# Altium schematic symbol library BARKO_SCHLIB.SchLib: 1064 symbols (part 5 of 11) (continued)
## IC-MC33063AVDG (continued)
IC REG BUCK BOOST INV ADJ 8SOIC; Manufacturer: ON Semiconductor; .PCBCHK: USED; .Creator: F:TALI; Max Input Voltage: 40V; Number of Outputs: 1; Output Current: 1.5A; Min Input Voltage: 3V; Switching Frequency: 100kHz; Synchronous Rectifier: No; Min Output Voltage: 1.25V; Topology: Buck-Boost; Output Type: Adjustable; Washability: OK; .SCHCHK: USED; Supplier 1: Digi-Key; Manufacturer Part Number: MC33063AVDG; Stock 1: 585; Pricing 1: 1=0.85000, 10=0.74800, 100=0.53300, 500=0.43092, 1000=0.32886 (USD); RoHS: Yes; Mount: Surface Mount; Case/Package: SOIC; Number of Pins: 8; Contact Plating: Tin,Matte; Min Operating Temperature: -40°C; Max Operating Temperature: 125°C; Output Voltage: 40V; Packaging: Rail/Tube; Max Output Current: 1.5A; Package Quantity: 98; Max Output Voltage: 40V; Length: 5mm; Height: 1.5mm; Width: 4mm; Radiation Hardening: No; REACH SVHC: No SVHC; Lead Free: Lead Free; Halogen Free: Halogen Free; ComponentLink1URL: https://datasheet.ciiva.com/16374/mc34063a-d-16374534.pdf?src-supplier=Future+Electronics; ComponentLink1Description: https://datasheet.ciiva.com/16374/mc34063a-d-16374534.pdf?src-supplier=Future+Electronics; ComponentLink2URL: https://datasheet.ciiva.com/2025/mc34063a-d-2025197.pdf?src-supplier=Digi-Key; ComponentLink2Description: https://datasheet.ciiva.com/2025/mc34063a-d-2025197.pdf?src-supplier=Digi-Key; Supplier Part Number 1: MC33063AVDG-ND
footprint SOIC8
pins: 1 SC (oc) "Switch Collector", 2 SE (oe) "Switch Emitter", 3 TC "Timing Capacitor", 4 GND (power), 5 CII (in) "Comparator Inverting Input", 6 VCC (power), 7 Ipk (in), 8 DC (oc) "Driver Collector"

## IC-MC34063ADG
designator U?, comment MC34063ADG  Case/Package: SOIC8
IC REG BUCK BOOST INV ADJ 8SOIC; Manufacturer: ON Semiconductor; Output Voltage: 40V; Max Output Current: 1.5A; Number of Outputs: 1; Min Input Voltage: 3V; Switching Frequency: 100kHz; Synchronous Rectifier: No; Min Output Voltage: 1.25V; Topology: Buck-Boost; Output Type: Adjustable; .PCBCHK: USED; .Creator: F:TALI; Washability: OK; Supplier 1: Digi-Key; Manufacturer Part Number: MC34063ADG; Stock 1: 0; Pricing 1: 1=0.58, 98=0.46061, 196=0.36847, 588=0.28952, 1078=0.22372 (USD); Mount: Surface Mount; Number of Pins: 8; Contact Plating: Matte,Tin; Min Operating Temperature: 0°C; Max Operating Temperature: 70°C; Package Quantity: 98; Packaging: Rail/Tube; Max Input Voltage: 40V; Output Current: 1.5A; Max Output Voltage: 40V; Length: 5mm; Height: 1.5mm; Width: 4mm; Radiation Hardening: No; Lead Free: Lead Free; REACH SVHC: No SVHC; Halogen Free: Halogen Free; ComponentLink1URL: http://www.onsemi.com/pub/Collateral/MC34063A-D.PDF; ComponentLink1Description: http://www.onsemi.com/pub/Collateral/MC34063A-D.PDF; ComponentLink2URL: https://www.distrelec.biz/Web/Downloads/6_/en/buONSemico_Schaltr-MC3406_EN.pdf?mime=application%2Fpdf; ComponentLink2Description: https://www.distrelec.biz/Web/Downloads/6_/en/buONSemico_Schaltr-MC3406_EN.pdf?mime=application%2Fpdf; ComponentLink3URL: http://components.arrow.com/part/dataview/40463195S7042617N5236; ComponentLink3Description: http://components.arrow.com/part/dataview/40463195S7042617N5236; ComponentLink4URL: http://www.farnell.com/datasheets/684078.pdf; ComponentLink4Description: http://www.farnell.com/datasheets/684078.pdf; ComponentLink5URL: http://www.rapidonline.com/pdf/47-3478.pdf; ComponentLink5Description: http://www.rapidonline.com/pdf/47-3478.pdf; Supplier Part Number 1: MC34063ADGOS-ND; .SCHCHK: USED
footprint SOIC8
pins: 1 SWITCH COLLECTOR, 2 SWITCH EMITTER, 3 TIMING CAPACITOR, 4 GND, 5 COMPARATOR INVERTING, 6 VCC, 7 Ipk SENSE, 8 DRIVER COLLECTOR

## IC-MCP6L01UT
designator U?, comment MCP6L01UT
IC OPAMP GP 1 CIRCUIT SOT23-5; Manufacturer: Microchip; Manufacturer Part Number: MCP6L01UT-E/OT; Max Supply Voltage: 6V; Min Supply Voltage: 1.8V; Voltage Gain: 105dB; Gain Bandwidth Product: 1MHz; Number of Channels: 1; Output Current: 20mA; Slew Rate: 0.6V/µs; Nominal Supply Current: 85uA; Common Mode Rejection Ratio: 78dB; Input Offset Voltage (Vos): 5mV; Input Bias Current: 2pA; Power Supply Rejection Ratio (PSRR): 83dB; Washability: OK; .Creator: M.OZKAN; .PCBCHK: USED; ComponentLink2Description: Datasheet; ComponentLink1Description: Manufacturer URL; PackageDescription: 5-Lead Plastic Small Outline Transistor (OT) [SOT-23]; PackageVersion: revBB, Aug-2009; Code_IPC: SOT23-5; PackageReference: SOT-23-OT5; ComponentLink2URL: http://ww1.microchip.com/downloads/en/DeviceDoc/22140b.pdf; ComponentLink1URL: http://www.microchip.com/; DatasheetVersion: revB, Sep-2011; ComponentLink3Description: Package Specification; RevisionNote: URLs added. DatasheetVersion updated.; ComponentLink3URL: http://www.microchip.com/stellent/groups/techpub_sg/documents/packagingspec/en012702.pdf; Supplier 1: Digi-Key; Supplier Part Number 1: MCP6L01UT-E/OTCT-ND; Stock 1: 4680; Pricing 1: 1=0.25000, 25=0.21000 (USD); RoHS: Yes; Mount: Surface Mount; Case/Package: SOT-23; Number of Pins: 5; Contact Plating: Tin,Matte; Min Operating Temperature: -40°C; Max Operating Temperature: 125°C; Packaging: Tape and Reel; Bandwidth: 1MHz; Unity Gain Bandwidth Product: 1MHz; Package Quantity: 3000; Number of Circuits: 1; Number of Elements: 1; Number of Amplifiers: 1; Length: 3.1mm; Height: 1.3mm; Width: 1.8mm; Radiation Hardening: No; REACH SVHC: No SVHC; Lead Free: Lead Free; ComponentLink4URL: https://datasheet.ciiva.com/1793/22140b-1793072.pdf?src-supplier=Digi-Key; ComponentLink4Description: https://datasheet.ciiva.com/1793/22140b-1793072.pdf?src-supplier=Digi-Key; ComponentLink5URL: https://datasheet.ciiva.com/22829/0900766b80db6492-22829231.pdf?src-supplier=RSComponents; ComponentLink5Description: https://datasheet.ciiva.com/22829/0900766b80db6492-22829231.pdf?src-supplier=RSComponents; ComponentLink6URL: https://datasheet.ciiva.com/26922/getdatasheetpartid-760447-26922790.pdf?src-supplier=Verical; ComponentLink6Description: https://datasheet.ciiva.com/26922/getdatasheetpartid-760447-26922790.pdf?src-supplier=Verical; ComponentLink7URL: https://datasheet.ciiva.com/8079/1669460-8079017.pdf?src-supplier=Element14; ComponentLink7Description: https://datasheet.ciiva.com/8079/1669460-8079017.pdf?src-supplier=Element14; ComponentLink8URL: https://datasheet.ciiva.com/16217/filehandler-aspxddocname-en540137-16217051.pdf?src-supplier=Future+Electronics; ComponentLink8Description: https://datasheet.ciiva.com/16217/filehandler-aspxddocname-en540137-16217051.pdf?src-supplier=Future+Electronics; ComponentLink9URL: https://datasheet.ciiva.com/17572/22140b-17572379.pdf?src-supplier=Avnet+Europe; ComponentLink9Description: https://datasheet.ciiva.com/17572/22140b-17572379.pdf?src-supplier=Avnet+Europe; ComponentLink10URL: https://datasheet.ciiva.com/1793/22140b-1793070.pdf?src-supplier=Digi-Key; ComponentLink10Description: https://datasheet.ciiva.com/1793/22140b-1793070.pdf?src-supplier=Digi-Key; ComponentLink11URL: https://datasheet.ciiva.com/1793/22140b-1793071.pdf?src-supplier=Digi-Key; ComponentLink11Description: https://datasheet.ciiva.com/1793/22140b-1793071.pdf?src-supplier=Digi-Key; ComponentLink12URL: https://datasheet.ciiva.com/11710/22140b-11710575.pdf?src-supplier=Avnet; ComponentLink12Description: https://datasheet.ciiva.com/11710/22140b-11710575.pdf?src-supplier=Avnet; ComponentLink13URL: https://datasheet.ciiva.com/41459/001085046-da-01-en-ic-opamp-1-0-mcp6l01ut-e-ot-sot-23-5-mcp-41459271.pdf?src-supplier=Conrad; ComponentLink13Description: https://datasheet.ciiva.com/41459/001085046-da-01-en-ic-opamp-1-0-mcp6l01ut-e-ot-sot-23-5-mcp-41459271.pdf?src-supplier=Conrad; .SCHCHK: USED
footprint SOT23-5
pins: 1 VIN+ (in), 2 VSS (power), 3 VIN- (in), 4 VOUT (out), 5 VDD (power)

## IC-MCP3561T-E/NC
designator U?, comment MCP3561T
IC ADC 24BIT SIGMA-DELTA 20UQFN; Manufacturer: Microchip; Manufacturer Part Number: MCP3561T-E/NC; Supplier 1: Digi-Key; Supplier Part Number 1: MCP3561T-E/NCCT-ND; Stock: 2998; Pricing: 1=2.95, 25=2.46, 100=2.24 (USD); RoHS: No; ComponentLink1Description: datasheet; ComponentLink1URL: https://ww1.microchip.com/downloads/en/DeviceDoc/MCP3561-2-4-Two-Four-Eight-Channel-153.6-ksps-Low-Noise-24-Bit-Delta-Sigma-ADCs-DS20006181B.pdf
footprint UQFN-20 EP (QFN, 20-Leads, Body 3x3mm, , Thermal Pad 1.7x1.7mm, IPC High Density)
pins: 1 REFIN_N, 2 REFIN_P, 3 CH0, 4 CH1, 5 NC1, 6 NC2, 7 NC3, 8 NC4, 9 NC5, 10 NC6, 11 ~{CS}, 12 SCK, 13 SDI, 14 SDO, 15 ~{IRQ}/MDAT, 16 MCLK, 17 DGND, 18 DVDD, 19 AVDD, 20 AGND, 21 AGND

## IC-MCP3564T-E/NC
designator U?, comment MCP3564T
IC ADC 24BIT SIGMA-DELTA 20UQFN; Manufacturer: Microchip; Manufacturer Part Number: MCP3564T-E/NC; Supplier 1: Digi-Key; Supplier Part Number 1: MCP3564T-E/NCCT-ND; Stock: 3226; Pricing: 1=6.06, 25=5.05, 100=4.59 (USD); RoHS: No
footprint UQFN-20 EP (QFN, 20-Leads, Body 3x3mm, , Thermal Pad 1.7x1.7mm, IPC High Density)
pins: 1 REFIN_N, 2 REFIN_P, 3 CH0, 4 CH1, 5 CH2, 6 CH3, 7 CH4, 8 CH5, 9 CH6, 10 CH7, 11 ~{CS}, 12 SCK, 13 SDI, 14 SDO, 15 ~{IRQ}/MDAT, 16 MCLK, 17 DGND, 18 DVDD, 19 AVDD, 20 AGND, 21 AGND

## IC-MIC1555YM5-TR
designator U?, comment MIC1555Y
IC OSC SINGLE TIMER 5MHZ SOT23-5; Manufacturer: Microchip; Manufacturer Part Number: MIC1555YM5-TR; Washability: OK; .Creator: M.OZKAN; .PCBCHK: USED; Supplier 1: Digi-Key; Supplier Part Number 1: 576-2576-1-ND; Stock: 4358; Pricing: 1=0.79, 25=0.66, 100=0.6 (USD); RoHS: Yes; ComponentLink1URL: https://datasheet.ciiva.com/15152/getdatasheetpartid-302289-15152644.pdf?src-supplier=Verical; ComponentLink1Description: https://datasheet.ciiva.com/15152/getdatasheetpartid-302289-15152644.pdf?src-supplier=Verical; ComponentLink2URL: https://datasheet.ciiva.com/6668/mic1555-6668311.pdf?src-supplier=Digi-Key; ComponentLink2Description: https://datasheet.ciiva.com/6668/mic1555-6668311.pdf?src-supplier=Digi-Key; ComponentLink3URL: https://datasheet.ciiva.com/6668/mic1555-6668313.pdf?src-supplier=Digi-Key; ComponentLink3Description: https://datasheet.ciiva.com/6668/mic1555-6668313.pdf?src-supplier=Digi-Key; ComponentLink4URL: https://datasheet.ciiva.com/6668/mic1555-6668315.pdf?src-supplier=Digi-Key; ComponentLink4Description: https://datasheet.ciiva.com/6668/mic1555-6668315.pdf?src-supplier=Digi-Key; .SCHCHK: USED
footprint SOT23-5
pins: 1 VS, 2 GND, 3 OUT, 4 TRG, 5 THR

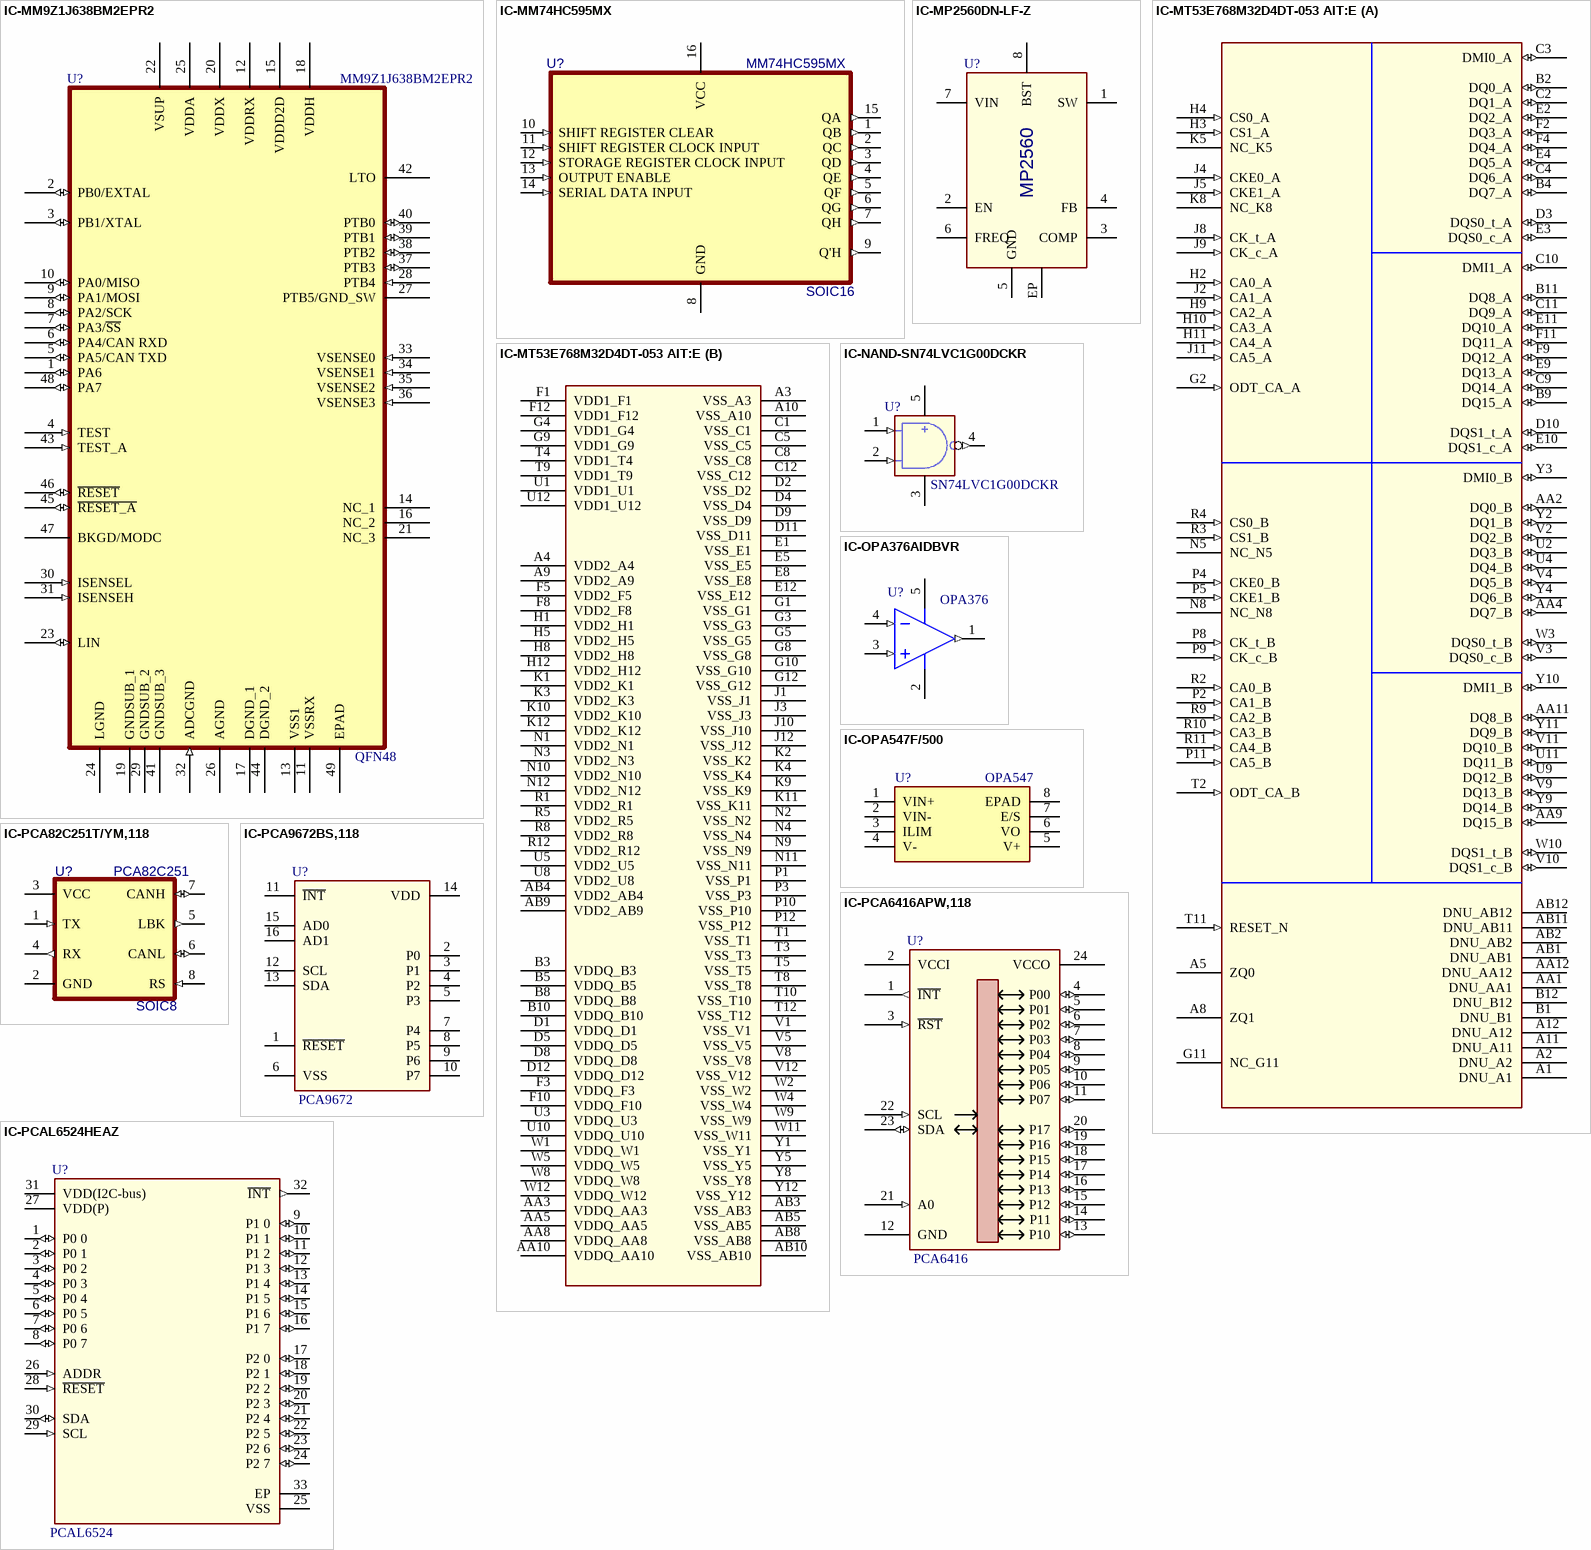
[diagram p16: symbols IC-MM9Z1J638BM2EPR2 to IC-PCAL6524HEAZ]

## IC-MM9Z1J638BM2EPR2
designator U?, comment MM9Z1J638BM2EPR2  Case/Package: QFN48
Battery Sensor Lead-Acid 30mA 2.5V 48-Pin QFN EP T/R; Manufacturer: NXP Freescale; Interface: CAN; Operating Supply Voltage: 28V; .Creator: F:TALI; .PCBCHK: USED; Washability: OK; Supplier 1: Digi-Key; Manufacturer Part Number: MM9Z1J638BM2EPR2; Stock 1: 0; Pricing 1: 2000=5.4538 (USD); Mount: Surface Mount; Number of Pins: 48; Min Operating Temperature: -40°C; Max Operating Temperature: 125°C; Output Current: 30mA; Output Voltage: 2.5V; Packaging: Tape and Reel; Radiation Hardening: No; ComponentLink1URL: http://www.freescale.com/files/analog/doc/data_sheet/MM9Z1_638D1.pdf; ComponentLink1Description: http://www.freescale.com/files/analog/doc/data_sheet/MM9Z1_638D1.pdf; Supplier Part Number 1: MM9Z1J638BM2EPR2-ND; .SCHCHK: USED
footprint QFN-EP-48
pins: 1 PA6 (io), 2 PB0/EXTAL (io), 3 PB1/XTAL (io), 4 TEST (in), 5 PA5/CAN TXD (io), 6 PA4/CAN RXD (io), 7 PA3/~{SS} (io), 8 PA2/SCK (io), 9 PA1/MOSI (io), 10 PA0/MISO (io), 11 VSSRX (power), 12 VDDRX (power), 13 VSS1 (power), 14 NC_1, 15 VDDD2D (power), 16 NC_2, 17 DGND_1 (power), 18 VDDH (power), 19 GNDSUB_1 (power), 20 VDDX (power), 21 NC_3, 22 VSUP (power), 23 LIN (io), 24 LGND (power), 25 VDDA (power), 26 AGND (power), 27 PTB5/GND_SW, 28 PTB4 (in), 29 GNDSUB_2 (power), 30 ISENSEL (in), 31 ISENSEH (in), 32 ADCGND (in), 33 VSENSE0 (in), 34 VSENSE1 (in), 35 VSENSE2 (in), 36 VSENSE3 (in), 37 PTB3 (io), 38 PTB2 (io), 39 PTB1 (io), 40 PTB0 (io), 41 GNDSUB_3 (power), 42 LTO, 43 TEST_A (in), 44 DGND_2 (power), 45 ~{RESET_A} (io), 46 ~{RESET} (io), 47 BKGD/MODC (oc), 48 PA7 (io), 49 EPAD (power)

## IC-MM74HC595MX
designator U?, comment MM74HC595MX  Case/Package: SOIC16
IC SHIFT REGISTER 8-BIT 16-SOIC; Manufacturer: ON Semiconductor / Fairchild; Direction: Unidirectional; Min Supply Voltage: 2V; Max Supply Voltage: 6V; Number of Elements: 1; Propagation Delay: 40ns; Number of Inputs: 5; Number of Bits per Element: 8; Number of Output Lines: 9; Quiescent Current: 8uA; .PCBCHK: USED; .Creator: F:TALI; Washability: OK; Supplier 1: Digi-Key; Manufacturer Part Number: MM74HC595MX; Stock 1: 1286; Pricing 1: 1=0.59, 10=0.508, 100=0.379, 500=0.29774, 1000=0.23008 (USD); Mount: Surface Mount; Number of Pins: 16; Weight: 0.005044oz; Contact Plating: Matte,Tin; Min Operating Temperature: -40°C; Max Operating Temperature: 85°C; Logic Function: Shift Register; Package Quantity: 2500; Packaging: Tape and Reel; Number of Circuits: 1; Number of Input Lines: 1; Number of Bits: 8; Turn-On Delay Time: 40ns; Voltage: 6V; Length: 10mm; Height: 1.5mm; Width: 4mm; Radiation Hardening: No; REACH SVHC: No SVHC; Lead Free: Lead Free; ComponentLink1URL: https://www.verical.com/server-webapp/html/getDatasheet?partID=88243; ComponentLink1Description: https://www.verical.com/server-webapp/html/getDatasheet?partID=88243; ComponentLink2URL: https://www.fairchildsemi.com/datasheets/MM/MM74HC595.pdf; ComponentLink2Description: https://www.fairchildsemi.com/datasheets/MM/MM74HC595.pdf; ComponentLink3URL: http://www.jameco.com/Jameco/Products/ProdDS/988047.pdf; ComponentLink3Description: http://www.jameco.com/Jameco/Products/ProdDS/988047.pdf; ComponentLink4URL: http://www.fairchildsemi.com/ds/MM/MM74HC595.pdf; ComponentLink4Description: http://www.fairchildsemi.com/ds/MM/MM74HC595.pdf; Supplier Part Number 1: MM74HC595MXDKR-ND; .SCHCHK: USED
footprint SOIC16
pins: 1 QB (out), 2 QC (out), 3 QD (out), 4 QE (out), 5 QF (out), 6 QG (out), 7 QH (out), 8 GND (power), 9 Q'H (out), 10 SHIFT REGISTER CLEAR (in), 11 SHIFT REGISTER CLOCK INPUT (in), 12 STORAGE REGISTER CLOCK INPUT (in), 13 OUTPUT ENABLE (in), 14 SERIAL DATA INPUT (in), 15 QA (out), 16 VCC (power)

## IC-MP2560DN-LF-Z
designator U?, comment MP2560
IC REG BUCK ADJ 2.5A; Manufacturer: Monolithic Power Systems; Manufacturer Part Number: MP2560DN-LF-Z; Number of Outputs: 1; Output Voltage: 39V; Min Input Voltage: 4.5V; Max Input Voltage: 42V; Efficiency: 93%; Min Output Voltage: 800mV; Switching Frequency: 4MHz; Synchronous Rectifier: No; Output Type: Adjustable; Output Configuration: Positive; Washability: OK; .Creator: M.OZKAN; .PCBCHK: USED; Supplier 1: Digi-Key; Supplier Part Number 1: 1589-1601-6-ND; Stock 1: 868; Pricing 1: 1=3.42, 10=3.07, 25=2.9024, 100=2.3865, 250=2.1414, 500=2.064, 1000=1.7157 (USD); Mount: Surface Mount; Case/Package: SOIC; Min Operating Temperature: -40°C; Max Operating Temperature: 85°C; Package Quantity: 2500; Packaging: Tape and Reel; Max Output Current: 2.5A; Max Output Voltage: 39V; Output Current: 2.5A; Operating Supply Voltage: 42V; Radiation Hardening: No; Lead Free: Lead Free; ComponentLink1URL: https://www.monolithicpower.com/pub/media/document/MP2560_r1.21.pdf?src-supplier=Digi-Key; ComponentLink1Description: https://www.monolithicpower.com/pub/media/document/MP2560_r1.21.pdf?src-supplier=Digi-Key; ComponentLink2URL: http://www.mouser.com/ds/2/277/MP2560_r1.21-477456.pdf?src-supplier=Mouser; ComponentLink2Description: http://www.mouser.com/ds/2/277/MP2560_r1.21-477456.pdf?src-supplier=Mouser; ComponentLink3URL: http://www.monolithicpower.com/Page/DownLoad.aspx?ListID=149b7d2b-0bb2-4ba6-a219-a0495acb8b0b&&ItemID=28&src-supplier=Avnet; ComponentLink3Description: http://www.monolithicpower.com/Page/DownLoad.aspx?ListID=149b7d2b-0bb2-4ba6-a219-a0495acb8b0b&&ItemID=28&src-supplier=Avnet; ComponentLink4URL: http://www.monolithicpower.com/DesktopModules/DocumentManage/API/Document/getDocument?id=1798&src-supplier=Digi-Key; ComponentLink4Description: http://www.monolithicpower.com/DesktopModules/DocumentManage/API/Document/getDocument?id=1798&src-supplier=Digi-Key; .SCHCHK: USED
footprint SOIC8-EP (SOIC, 8-Leads, Body 5x4mm, Pitch 1.27mm, IPC Low Density)
pins: 1 SW, 2 EN, 3 COMP, 4 FB, 5 GND, 6 FREQ, 7 VIN, 8 BST, EP GND

## IC-MT53E768M32D4DT-053 AIT:E
designator U?, comment MT53E768M32D4DT-053 AIT:E  (value not drawn)
IC MEM MOBILE LPDDR4 SDRAM 768 Meg x 32 1.1V VFBGA200; Manufacturer Part Number: MT53E768M32D4DT-053 AIT:E
footprint 200-FBGA
part A pins: A1 DNU_A1, A2 DNU_A2, A5 ZQ0, A8 ZQ1, A11 DNU_A11, A12 DNU_A12, AA1 DNU_AA1, AA2 DQ0_B (io), AA4 DQ7_B (io), AA9 DQ15_B (io), AA11 DQ8_B (io), AA12 DNU_AA12, AB1 DNU_AB1, AB2 DNU_AB2, AB11 DNU_AB11, AB12 DNU_AB12, B1 DNU_B1, B2 DQ0_A (io), B4 DQ7_A (io), B9 DQ15_A (io), B11 DQ8_A (io), B12 DNU_B12, C2 DQ1_A (io), C3 DMI0_A (io), C4 DQ6_A (io), C9 DQ14_A (io), C10 DMI1_A (io), C11 DQ9_A (io), D3 DQS0_t_A (io), D10 DQS1_t_A (io), E2 DQ2_A (io), E3 DQS0_c_A (io), E4 DQ5_A (io), E9 DQ13_A (io), E10 DQS1_c_A (io), E11 DQ10_A (io), F2 DQ3_A (io), F4 DQ4_A (io), F9 DQ12_A (io), F11 DQ11_A (io), G2 ODT_CA_A (in), G11 NC_G11, H2 CA0_A (in), H3 CS1_A (in), H4 CS0_A (in), H9 CA2_A (in), H10 CA3_A (in), H11 CA4_A (in), J2 CA1_A (in), J4 CKE0_A (in), J5 CKE1_A (in), J8 CK_t_A (in), J9 CK_c_A (in), J11 CA5_A (in), K5 NC_K5, K8 NC_K8, N5 NC_N5, N8 NC_N8, P2 CA1_B (in), P4 CKE0_B (in), P5 CKE1_B (in), P8 CK_t_B (in), P9 CK_c_B (in), P11 CA5_B (in), R2 CA0_B (in), R3 CS1_B (in), R4 CS0_B (in), R9 CA2_B (in), R10 CA3_B (in), R11 CA4_B (in), T2 ODT_CA_B (in), T11 RESET_N (in), U2 DQ3_B (io), U4 DQ4_B (io), U9 DQ12_B (io), U11 DQ11_B (io), V2 DQ2_B (io), V3 DQS0_c_B (io), V4 DQ5_B (io), V9 DQ13_B (io), V10 DQS1_c_B (io), V11 DQ10_B (io), W3 DQS0_t_B (io), W10 DQS1_t_B (io), Y2 DQ1_B (io), Y3 DMI0_B (io), Y4 DQ6_B (io), Y9 DQ14_B (io), Y10 DMI1_B (io), Y11 DQ9_B (io)
part B pins: A3 VSS_A3 (power), A4 VDD2_A4 (power), A9 VDD2_A9 (power), A10 VSS_A10 (power), AA3 VDDQ_AA3 (power), AA5 VDDQ_AA5 (power), AA8 VDDQ_AA8 (power), AA10 VDDQ_AA10 (power), AB3 VSS_AB3 (power), AB4 VDD2_AB4 (power), AB5 VSS_AB5 (power), AB8 VSS_AB8 (power), AB9 VDD2_AB9 (power), AB10 VSS_AB10 (power), B3 VDDQ_B3 (power), B5 VDDQ_B5 (power), B8 VDDQ_B8 (power), B10 VDDQ_B10 (power), C1 VSS_C1 (power), C5 VSS_C5 (power), C8 VSS_C8 (power), C12 VSS_C12 (power), D1 VDDQ_D1 (power), D2 VSS_D2 (power), D4 VSS_D4 (power), D5 VDDQ_D5 (power), D8 VDDQ_D8 (power), D9 VSS_D9 (power), D11 VSS_D11 (power), D12 VDDQ_D12 (power), E1 VSS_E1 (power), E5 VSS_E5 (power), E8 VSS_E8 (power), E12 VSS_E12 (power), F1 VDD1_F1 (power), F3 VDDQ_F3 (power), F5 VDD2_F5 (power), F8 VDD2_F8 (power), F10 VDDQ_F10 (power), F12 VDD1_F12 (power), G1 VSS_G1 (power), G3 VSS_G3 (power), G4 VDD1_G4 (power), G5 VSS_G5 (power), G8 VSS_G8 (power), G9 VDD1_G9 (power), G10 VSS_G10 (power), G12 VSS_G12 (power), H1 VDD2_H1 (power), H5 VDD2_H5 (power), H8 VDD2_H8 (power), H12 VDD2_H12 (power), J1 VSS_J1 (power), J3 VSS_J3 (power), J10 VSS_J10 (power), J12 VSS_J12 (power), K1 VDD2_K1 (power), K2 VSS_K2 (power), K3 VDD2_K3 (power), K4 VSS_K4 (power), K9 VSS_K9 (power), K10 VDD2_K10 (power), K11 VSS_K11 (power), K12 VDD2_K12 (power), N1 VDD2_N1 (power), N2 VSS_N2 (power), N3 VDD2_N3 (power), N4 VSS_N4 (power), N9 VSS_N9 (power), N10 VDD2_N10 (power), N11 VSS_N11 (power), N12 VDD2_N12 (power), P1 VSS_P1 (power), P3 VSS_P3 (power), P10 VSS_P10 (power), P12 VSS_P12 (power), R1 VDD2_R1 (power), R5 VDD2_R5 (power), R8 VDD2_R8 (power), R12 VDD2_R12 (power), T1 VSS_T1 (power), T3 VSS_T3 (power), T4 VDD1_T4 (power), T5 VSS_T5 (power), T8 VSS_T8 (power), T9 VDD1_T9 (power), T10 VSS_T10 (power), T12 VSS_T12 (power), U1 VDD1_U1 (power), U3 VDDQ_U3 (power), U5 VDD2_U5 (power), U8 VDD2_U8 (power), U10 VDDQ_U10 (power), U12 VDD1_U12 (power), V1 VSS_V1 (power), V5 VSS_V5 (power), V8 VSS_V8 (power), V12 VSS_V12 (power), W1 VDDQ_W1 (power), W2 VSS_W2 (power), W4 VSS_W4 (power), W5 VDDQ_W5 (power), W8 VDDQ_W8 (power), W9 VSS_W9 (power), W11 VSS_W11 (power), W12 VDDQ_W12 (power), Y1 VSS_Y1 (power), Y5 VSS_Y5 (power), Y8 VSS_Y8 (power), Y12 VSS_Y12 (power)